# Altium footprint library Selex_PCBLib.PcbLib: 388 footprints (part 6 of 25)
Each footprint in its own frame and in the unit in brackets; x right, y up, seen from the top. Pads: shape width x height; smd on the part's side, far side on the other; paste and mask are expansions set on the pad; w line width, h text height; cw(c..) or ccw(c..) is an arc to the next point about the centre after c.
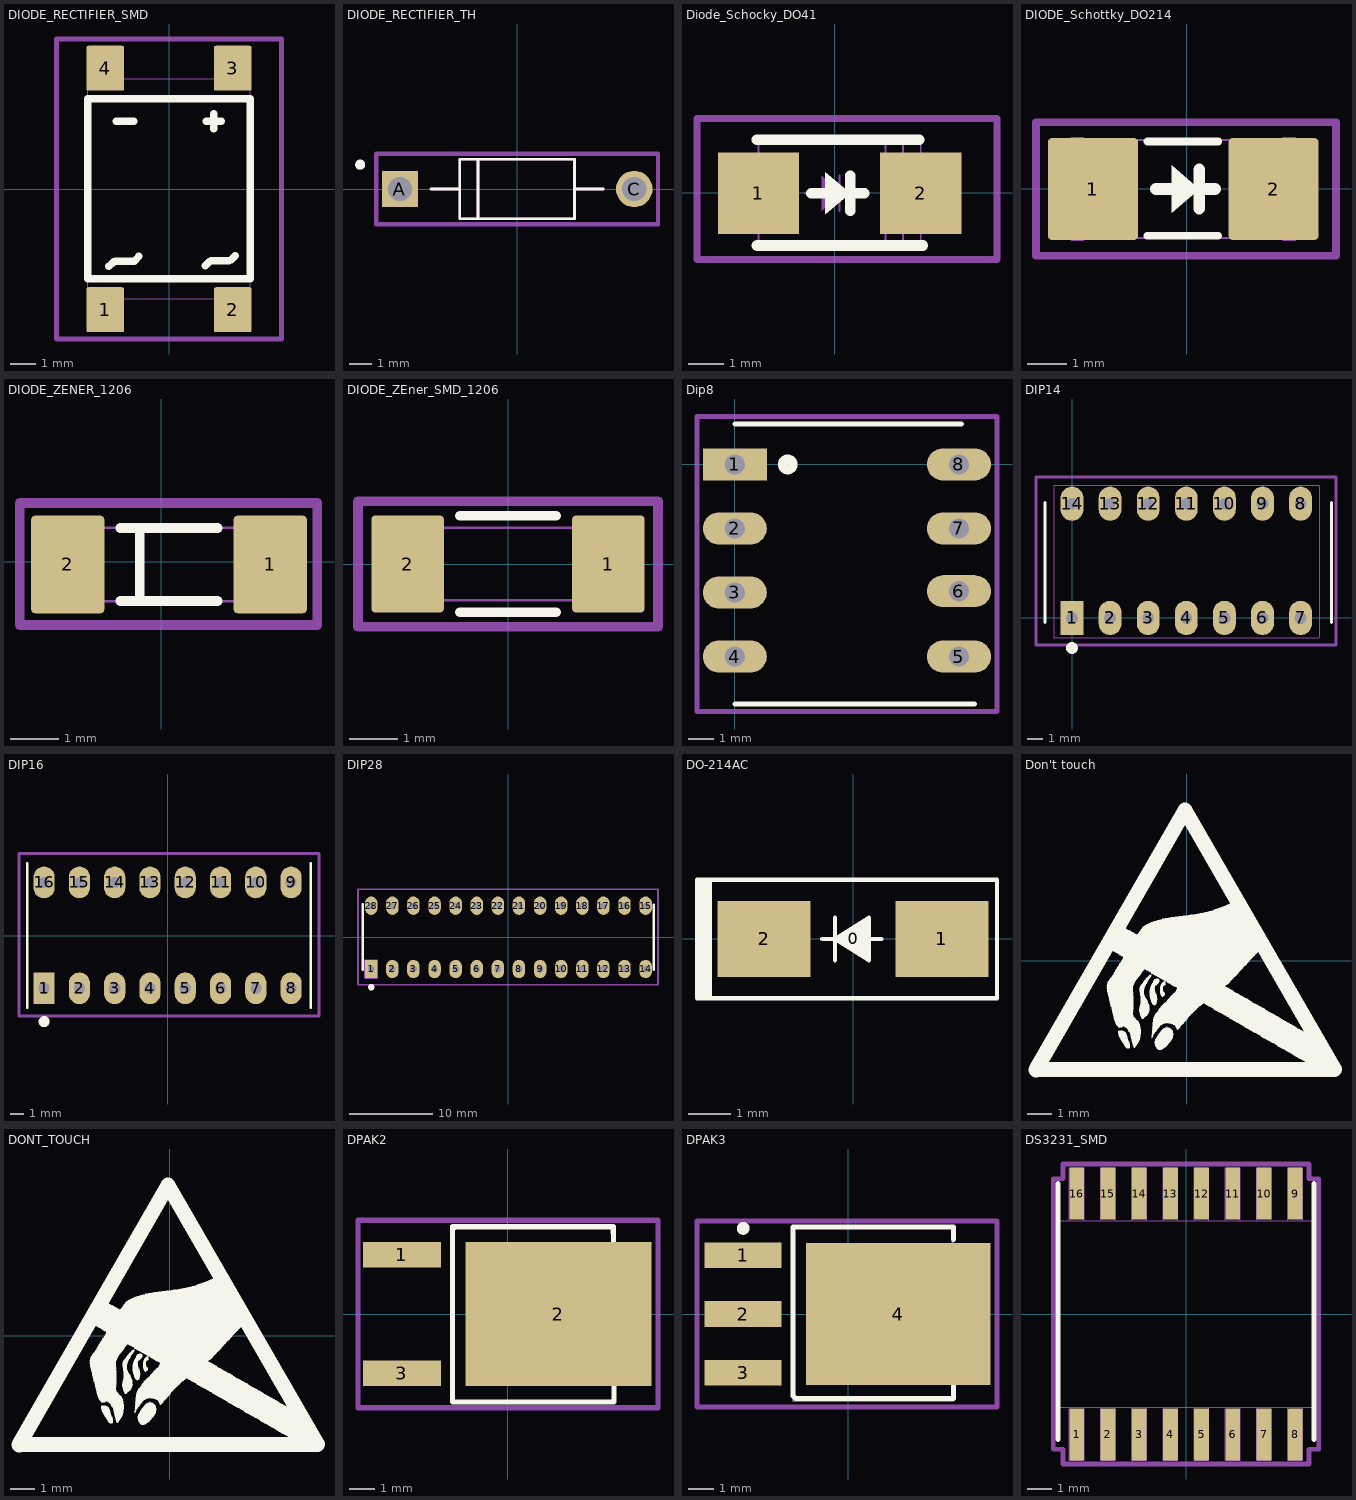
[diagram p5: the footprints below, top view; thin cyan lines are the x and y axes]

## DIODE_RECTIFIER_SMD [mm]
pads (4):
  rrect10% 1.5x1.8 smd mask+0.05: 1(-2.55,-4.83) 2(2.55,-4.83) 3(2.55,4.83) 4(-2.55,4.83)
Top Overlay:
  lines w0.3: -2.4,-3.1 -2.235,-2.935 cw(c-2.15,-3.021) -2.15,-2.9 -1.45,-2.9 ccw(c-1.45,-2.779) -1.365,-2.865 -1.2,-2.7 ; -2.1,2.7 -1.4,2.7 ; 1.45,-3.07 1.615,-2.905 ; 1.5,2.7 2.1,2.7 ; 1.7,-2.87 2.4,-2.87 ; 1.8,2.4 1.8,3 ; 2.485,-2.835 2.65,-2.67 ; -3.25,-3.6 3.25,-3.6 3.25,3.6 -3.25,3.6 -3.25,-3.6
Mechanical 1:
  lines w0.05: -3.25,-4.4 3.25,-4.4 3.25,4.4 -3.25,4.4 -3.25,-4.4
Mechanical 15:
  lines w0.2: -4.5,-6 -4.5,6 4.5,6 4.5,-6 -4.5,-6
3D body "User Library-DB107S  DB-S.STEP": height 2.66, standoff 0, extent -4.14,-5.11 4.18,5.29

## DIODE_RECTIFIER_TH [mm]
pads (2):
  rect 1.65x1.65 hole 1.1: A(-5.3,0)
  round 1.65 hole 1.1: C(5.3,0)
Top Overlay:
  circle w0.254: c-7.1,1.1 r0.1
  lines w0.127: -3.9,0 -2.6,0 ; 3.9,0 2.6,0 ; -2.6,0 -2.6,-1.35 -1.775,-1.35 ; -2.6,0 -2.6,1.35 -1.775,1.35 ; -1.775,-1.35 -1.775,1.35 ; -1.775,-1.35 2.6,-1.35 2.6,0 ; -1.775,1.35 2.6,1.35 2.6,0
Mechanical 13:
  lines w0.127: -3.9,0 -2.6,0 ; 3.9,0 2.6,0 ; -2.6,0 -2.6,-1.35 -1.775,-1.35 ; -2.6,0 -2.6,1.35 -1.775,1.35 ; -1.775,-1.35 -1.775,1.35 ; -1.775,-1.35 2.6,-1.35 2.6,0 ; -1.775,1.35 2.6,1.35 2.6,0
Mechanical 15:
  lines w0.2: -6.375,-1.6 -6.375,1.6 6.375,1.6 6.375,-1.6 -6.375,-1.6

## Diode_Schocky_DO41 [mm]
pads (2):
  rect 2.3x2.3 smd mask+0.05: 1(-2.16,-0.02) 2(2.44,-0.02)
Top Overlay:
  region: -0.26,0.58 -0.26,-0.62 0.44,-0.02
  lines w0.3: -2.2,-1.5 2.5,-1.5 ; -2.2,1.5 2.4,1.5 ; -0.66,-0.02 -0.26,-0.02 ; 0.44,-0.52 0.44,0.48 ; 0.54,-0.02 0.84,-0.02
Mechanical 1:
  region: -0.36,0.48 -0.36,-0.52 0.14,-0.02
  lines w0.05: -0.86,-0.02 -0.36,-0.02 ; 0.14,-0.52 0.14,0.48 ; 0.14,-0.02 0.64,-0.02 ; 1.44,-1.468 1.44,1.428 ; 1.94,-1.468 1.94,1.428 ; -2.159,-1.468 2.438,-1.468 2.438,1.428 -2.159,1.428 -2.159,-1.468
Mechanical 15:
  lines w0.2: -3.9,-1.9 -3.9,-0.5 -3.9,2.1 -1.4,2.1 4.6,2.1 4.6,-1.9 -3.9,-1.9
3D body "DO214AC.step": height 2.15, standoff -0.05, extent -2.36,-1.37 2.64,1.33

## DIODE_Schottky_DO214 [mm] "DO214"
pads (2):
  rrect10% 2.3x2.6 smd mask+0.05: 1(-2.39,-0.01) 2(2.21,-0.01)
Top Overlay:
  region: -0.385,0.59 -0.385,-0.61 0.315,-0.01
  lines w0.2: -1,-1.2 0.8,-1.2 ; -1,1.2 0.8,1.2
  lines w0.3: -0.785,-0.01 -0.385,-0.01 ; 0.315,-0.51 0.315,0.49 ; 0.415,-0.01 0.715,-0.01
Mechanical 1:
  region: -0.285,0.49 -0.285,-0.51 0.215,-0.01
  lines w0.05: -0.785,-0.01 -0.285,-0.01 ; 0.215,-0.51 0.215,0.49 ; 0.215,-0.01 0.715,-0.01 ; -2.59,-1.26 -2.64,-1.31 -2.94,-1.31 -2.94,1.29 -2.64,1.29 -2.59,1.24 ; -2.59,-1.26 -2.59,1.24 ; -2.59,-1.26 2.41,-1.26 ; -2.59,-1.26 -2.59,1.24 ; -2.59,1.24 2.41,1.24 ; 2.41,-1.26 2.46,-1.31 2.76,-1.31 2.76,1.29 2.46,1.29 2.41,1.24 ; 2.41,-1.26 2.41,1.24
Mechanical 15:
  lines w0.2: -3.84,-1.71 -3.84,1.69 3.8,1.69 3.8,-1.71 -3.84,-1.71
3D body "User Library-DO-214AC(SMA).step": height 2.14, standoff -0.14, extent -2.933,-1.404 2.553,1.39

## DIODE_ZENER_1206 [mm]
pads (2):
  rrect10% 1.5x2 smd mask+0.05: 1(2.235,-0.06) 2(-1.915,-0.06)
Top Overlay:
  lines w0.2: -0.84,-0.81 1.16,-0.81 ; -0.84,0.69 1.16,0.69 ; -0.44,-0.81 -0.44,0.69
Mechanical 1:
  lines w0.05: -1.59,-0.81 1.91,-0.81 1.91,0.69 -1.59,0.69 -1.59,-0.81
Mechanical 15:
  lines w0.2: -2.9,-1.3 3.2,-1.3 3.2,0 3.2,1.2 -2.9,1.2 -2.9,-1.3
3D body "User Library-smd diode 1206.step": height 1.53, standoff 0.08, extent -1.59,-0.785 1.91,0.665

## DIODE_ZEner_SMD_1206 [mm] "DIODE ZENER SMD 1206"
pads (2):
  rrect10% 1.5x2 smd mask+0.05: 1(2.075,0) 2(-2.075,0)
Top Overlay:
  lines w0.2: -1,-1 1,-1 ; -1,1 1,1
Mechanical 1:
  lines w0.05: -1.75,-0.75 1.75,-0.75 1.75,0.75 -1.75,0.75 -1.75,-0.75
Mechanical 15:
  lines w0.2: -3.1,-1.3 3.1,-1.3 3.1,1.3 -3.1,1.3 -3.1,-1.3
3D body "User Library-smd diode 1206.step": height 1.53, standoff 0.08, extent -1.75,-0.725 1.75,0.725

## Dip8 [mm] "Dual Inline Package 8 pins"
pads (8):
  rect 2.54x1.27 hole 0.8: 1(0,0)
  oval 2.54x1.27 hole 0.8: 2(0,-2.54) 3(0,-5.08) 4(0,-7.62) 5(8.89,-7.62) 6(8.89,-5.03) 7(8.89,-2.54) 8(8.89,0)
Top Overlay:
  circle w0.381: c2.1,0 r0.203
  lines w0.2: 0,-9.5 9.5,-9.5 ; 0,1.6 9,1.6
Mechanical 15:
  lines w0.2: -1.5,-9.8 10.4,-9.8 10.4,1.9 -1.5,1.9 -1.5,-9.8
3D body: height 0.5, standoff -3.8, extent 8.42,-7.945 8.77,-7.395
3D body: height 3, standoff 0.5, extent 8.42,-8.42 8.77,-6.92
3D body: height 3, standoff 2.65, extent 6.895,-8.37 8.595,-6.87
3D body: height 3, standoff 2.65, extent 0.205,-8.37 1.905,-6.87
3D body: height 5.3, standoff 0.3, extent 1.905,-8.89 6.985,1.27
3D body: height 3, standoff 2.65, extent 0.205,-0.75 1.905,0.75
3D body: height 3, standoff 0.5, extent 0.03,-0.75 0.38,0.75
3D body: height 0.5, standoff -3.8, extent 0.03,-0.275 0.38,0.275
3D body: height 3, standoff 2.65, extent 0.205,-3.29 1.905,-1.79
3D body: height 3, standoff 0.5, extent 0.03,-3.29 0.38,-1.79
3D body: height 0.5, standoff -3.8, extent 0.03,-2.815 0.38,-2.265
3D body: height 3, standoff 2.65, extent 0.205,-5.83 1.905,-4.33
3D body: height 3, standoff 0.5, extent 0.03,-5.83 0.38,-4.33
3D body: height 0.5, standoff -3.8, extent 0.03,-5.355 0.38,-4.805
3D body: height 3, standoff 2.65, extent 6.895,-5.83 8.595,-4.33
3D body: height 3, standoff 0.5, extent 8.42,-5.83 8.77,-4.33
3D body: height 0.5, standoff -3.8, extent 8.42,-5.355 8.77,-4.805
3D body: height 3, standoff 2.65, extent 6.895,-3.29 8.595,-1.79
3D body: height 3, standoff 0.5, extent 8.42,-3.29 8.77,-1.79
3D body: height 0.5, standoff -3.8, extent 8.42,-2.815 8.77,-2.265
3D body: height 3, standoff 2.65, extent 6.895,-0.75 8.595,0.75
3D body: height 3, standoff 0.5, extent 8.42,-0.75 8.77,0.75
3D body: height 0.5, standoff -3.8, extent 8.42,-0.275 8.77,0.275
3D body: height 0.5, standoff -3.8, extent 0.03,-7.895 0.38,-7.345
3D body: height 3, standoff 0.5, extent 0.03,-8.37 0.38,-6.87
3D body: height 5.4, standoff 4, extent 3.449,0.27 5.449,1.27

## DIP14 [mil]
pads (14):
  rect 60x90 hole 31: 1(0,0)
  oval 60x90 hole 31: 2(100,0) 3(200,0) 4(300,0) 5(400,0) 6(500,0) 7(600,0) 8(600,300) 9(500,300) 10(400,300) 11(300,300) 12(200,300) 13(100,300) 14(0,300)
Top Overlay:
  circle w15: c0,-78.74 r8
  lines w7.87: -70.87,-11.81 -70.87,303.15 ; 681.1,-11.81 681.1,303.15
Mechanical 1:
  lines w1.97: -48.23,-52.17 647.64,-52.17 650.59,-49.21 650.59,345.47 647.64,348.43 -47.24,348.43 -47.24,-51.18 -48.23,-52.17
Mechanical 15:
  lines w7.87: -94.49,-70.87 -94.49,370.08 692.91,370.08 692.91,-70.87 -94.49,-70.87
3D body "SW3DPS-DIP-14-DEFAULT.STEP": height 145.48, standoff -129.32, extent -69.99,-12.47 680.01,302.49

## DIP16 [mil] "2p54x7p62"
pads (16):
  rrect10% 60x90 hole 31.5: 1(-350,-149.61)
  oval 60x90 hole 31.5: 2(-250,-149.61) 3(-150,-149.61) 4(-50,-149.61) 5(50,-149.61) 6(150,-149.61) 7(250,-149.61) 9(350,150.39) 10(250,150.39) 11(150,150.39) 12(50,150.39) 13(-50,150.39) 14(-150,150.39) 15(-250,150.39) 16(-350,150.39)
  oval 60x90 hole 30.98: 8(350,-149.61)
Top Overlay:
  circle w15: c-350,-244.09 r8
  lines w7.87: -397.64,-204.72 -397.64,204.72 ; 405.51,-204.72 405.51,204.33
Mechanical 15:
  lines w7.87: -421.26,-228.35 429.13,-228.35 429.13,232.28 -421.26,232.28 -421.26,-228.35
3D body "SW3dPS-DIP 16 _ socket 214.STEP": height 299.42, standoff -131.12, extent -401.7,-206.99 401.7,206.39

## DIP28 [mm] "2p54x7p62"
pads (29):
  rrect10% 1.5x2.2 hole 0.8: 1(-16.51,-3.81)
  oval 1.5x2.2 hole 0.8 mask+0.05: 2(-13.97,-3.81) 2(-13.97,-3.81) 3(-11.43,-3.81) 4(-8.89,-3.81) 5(-6.35,-3.81) 6(-3.81,-3.81) 7(-1.27,-3.81) 8(1.27,-3.81) 9(3.81,-3.81) 10(6.35,-3.81) 11(8.89,-3.81) 12(11.43,-3.81) 13(13.97,-3.81) 14(16.51,-3.81)
  oval 1.5x2.2 hole 0.8: 15(16.51,3.81) 16(13.97,3.81) 17(11.43,3.81) 18(8.89,3.81) 19(6.35,3.81) 20(3.81,3.81) 21(1.27,3.81) 22(-1.27,3.81) 23(-3.81,3.81) 24(-6.35,3.81) 25(-8.89,3.81) 26(-11.43,3.81) 27(-13.97,3.81) 28(-16.51,3.81)
Top Overlay:
  circle w0.381: c-16.5,-6 r0.203
  lines w0.3: -17.5,-3.9 -17.5,4 ; 17.5,-3.9 17.5,3.9
Mechanical 1:
  lines w0.05: -17.26,-4.91 -15.76,-4.91 ; -17.26,-4.91 -17.26,-2.71 ; -17.26,-4.91 -17.26,-2.71 ; -17.26,-4.91 -15.76,-4.91 ; -17.26,-2.71 -15.76,-2.71 ; -17.26,-2.71 -15.76,-2.71 ; -15.76,-4.91 -15.76,-2.71 ; -15.76,-4.91 -15.76,-2.71
Mechanical 15:
  lines w0.2: -18.1,-5.7 -18.1,5.8 18,5.8 18,-5.7 -18.1,-5.7
3D body "User Library-User Library-ATmega 48_88_168_328 28P3_90DEG.step": height 5.04, standoff -2.08, extent -17.325,-3.953 17.325,3.953

## DO-214AC [mm]
pads (3):
  round 0.508 on Mech14: 0(0,0)
  rect 2.2x1.8 smd: 1(2.1,0) 2(-2.1,0)
Top Overlay:
  rectangle: -3.686,-1.4 -3.386,1.4
  region: 0.375,-0.5 0.375,0.5 -0.425,0
  lines w0.1: -0.725,0 -0.425,0 ; -0.425,-0.5 -0.425,0 ; -0.425,0.5 -0.425,0 ; 0.375,0 0.675,0 ; -0.425,0 0.375,-0.5 0.375,0.5 -0.425,0 ; -3.687,-1.4 -3.387,-1.4 -3.387,1.4 -3.687,1.4 -3.687,0.9 -3.687,-1.4 ; -3.4,-1.4 3.4,-1.4 3.4,1.4 -3.4,1.4 -3.4,-1.4
3D body "SW3dPS-DO-214AC SMA.STEP": height 2.42, standoff 0.02, extent -2.6,-1.3 2.6,1.3

## Don't touch [mm]
Top Overlay:
  drawing of 7 lines, arcs and shapes, not listed

## DONT_TOUCH [mm]
Top Overlay:
  drawing of 7 lines, arcs and shapes, not listed

## DPAK2 [mm]
pads (3):
  rect 3x1 smd: 1(-4.1,2.29) 3(-4.1,-2.29)
  rect 7.2x5.55 smd: 2(1.95,0)
Top Overlay:
  lines w0.2: -2.15,3.375 4.07,3.375 4.075,2.8 ; -2.05,3.35 -2.15,3.35 -2.15,-3.4 4.1,-3.4 4.1,-2.8
Mechanical 13:
  lines w0.1: -2.15,3.375 -2.15,-3.375 4.07,-3.375 4.07,3.375
Mechanical 15:
  lines w0.2: -5.8,-3.625 5.8,-3.625 5.8,3.625 -5.8,3.625 -5.8,-3.625
3D body "User Library-DPAK_TO-252AA.STEP": height 2.37, standoff -0.03, extent -4.998,-3.367 5.102,3.367

## DPAK3 [mm]
pads (4):
  rect 3x1 smd: 1(-4.1,2.29) 2(-4.1,0) 3(-4.1,-2.29)
  rect 7.2x5.55 smd: 4(1.95,0)
Top Overlay:
  circle w0.25: c-4.1,3.34 r0.125
  lines w0.2: 4.1,-2.8 4.1,-3.3 -2.05,-3.3 -2.15,-3.2 -2.15,3.4 -2.1,3.4 4.1,3.4 4.1,2.9
Mechanical 13:
  lines w0.1: -2.15,-3.375 -2.15,3.375 4.07,3.375 4.07,-3.375 -2.15,-3.375
Mechanical 15:
  lines w0.2: -5.9,-3.625 -5.9,3.625 5.8,3.625 5.8,-3.625 -5.9,-3.625
3D body: height 2.38, standoff 0, extent -2.15,-3.375 4.07,3.375

## DS3231_SMD [mm] "SMD, 16SO, W16#H2, 21-0042"
height 2.65
pads (16):
  rrect10% 0.6x2.1 smd mask+0.1: 1(-4.445,-4.9) 2(-3.175,-4.9) 3(-1.905,-4.9) 4(-0.635,-4.9) 5(0.635,-4.9) 6(1.905,-4.9) 7(3.175,-4.9) 8(4.445,-4.9) 9(4.445,4.9) 10(3.175,4.9) 11(1.905,4.9) 12(0.635,4.9) 13(-0.635,4.9) 14(-1.905,4.9) 15(-3.175,4.9) 16(-4.445,4.9)
Top Overlay:
  lines w0.2: -5.2,-5.1 -5.2,5.3 ; 5.2,-5.1 5.2,5.3
Mechanical 1:
  lines w0.05: -4.745,-5.95 -4.145,-5.95 ; -4.745,-5.95 -4.745,-3.8 ; -4.745,-5.95 -4.745,-3.8 ; -4.745,-5.95 -4.145,-5.95 ; -4.745,-3.8 -4.145,-3.8 ; -4.145,-5.95 -4.145,-3.8 ; -4.145,-5.95 -4.145,-3.8 ; 4.145,5.95 4.145,3.8 4.145,5.95 ; 4.145,5.95 4.745,5.95 ; 4.145,5.95 4.745,5.95 ; 4.745,3.8 4.745,5.95 ; 4.745,3.8 4.745,5.95 ; 4.745,3.8 4.745,5.95 ; -5.25,-3.8 -5.25,3.8 5.25,3.8 5.25,-3.8 -5.25,-3.8 ; -4.745,3.8 -4.145,3.8 -4.145,5.95 -4.745,5.95 -4.745,3.8 ; -3.475,-5.95 -3.475,-3.8 -2.875,-3.8 -2.875,-5.95 -3.475,-5.95 ; -3.475,3.8 -2.875,3.8 -2.875,5.95 -3.475,5.95 -3.475,3.8 ; -2.205,-5.95 -2.205,-3.8 -1.605,-3.8 -1.605,-5.95 -2.205,-5.95 ; -2.205,3.8 -1.605,3.8 -1.605,5.95 -2.205,5.95 -2.205,3.8 ; -0.935,-5.95 -0.935,-3.8 -0.335,-3.8 -0.335,-5.95 -0.935,-5.95 ; -0.935,3.8 -0.335,3.8 -0.335,5.95 -0.935,5.95 -0.935,3.8 ; 0.335,-5.95 0.335,-3.8 0.935,-3.8 0.935,-5.95 0.335,-5.95 ; 0.335,3.8 0.935,3.8 0.935,5.95 0.335,5.95 0.335,3.8 ; 1.605,-5.95 1.605,-3.8 2.205,-3.8 2.205,-5.95 1.605,-5.95 ; 1.605,3.8 2.205,3.8 2.205,5.95 1.605,5.95 1.605,3.8 ; 2.875,-5.95 2.875,-3.8 3.475,-3.8 3.475,-5.95 2.875,-5.95 ; 2.875,3.8 3.475,3.8 3.475,5.95 2.875,5.95 2.875,3.8 ; 4.145,-5.95 4.145,-3.8 4.745,-3.8 4.745,-5.95 4.145,-5.95
Mechanical 15:
  lines w0.2: -5.4,0.6 -5.4,5.5 -5,5.5 -5,6.1 5,6.1 5,5.5 5.4,5.5 5.4,-5.5 5,-5.5 5,-6.1 -5,-6.1 -5,-5.5 -5.4,-5.5 -5.4,1
3D body "User Library-SO-16W.STEP": height 2.48, standoff 0, extent -5.165,-5.055 5.165,5.255